# Altium footprint library MEBot.PcbLib: 161 footprints (part 11 of 11)
Each footprint in its own frame and in the unit in brackets; x right, y up, seen from the top. Pads: shape width x height; smd on the part's side, far side on the other; paste and mask are expansions set on the pad; w line width, h text height; cw(c..) or ccw(c..) is an arc to the next point about the centre after c.
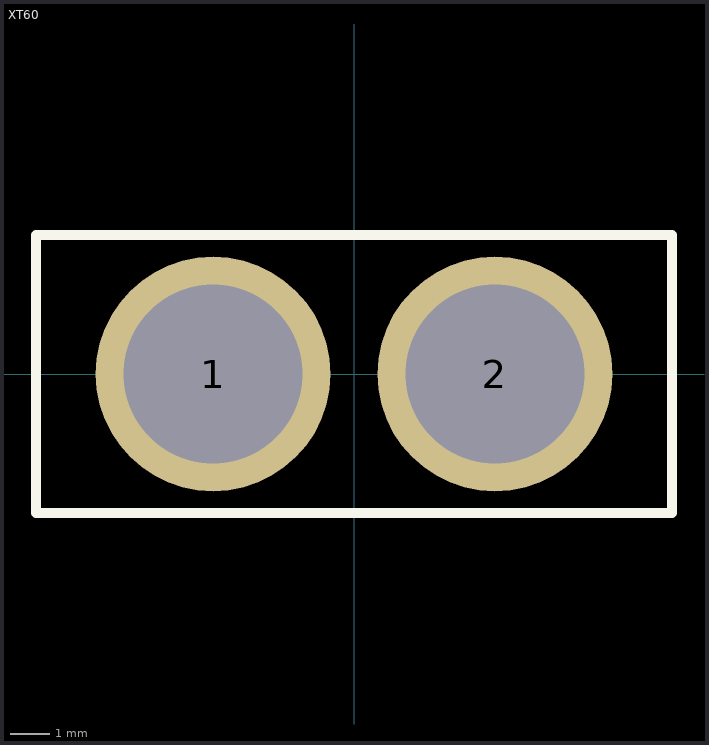
[diagram p10: the footprint, top view; thin cyan lines are the x and y axes]

## XT60 [mm] "power connector"
pads (2):
  round 6 hole 4.572: 1(-3.6,0) 2(3.6,0)
Top Overlay:
  lines w0.254: -8.128,-3.556 8.128,-3.556 8.128,3.556 -8.128,3.556 -8.128,-3.556
3D body "XT60FemaleConnector.STEP": height 16, standoff -4.5, extent -8.295,-3.69 8.255,3.81